# Altium footprint library Vowstar_IC_General.PcbLib: 139 footprints (part 7 of 9)
Each footprint in its own frame and in the unit in brackets; x right, y up, seen from the top. Pads: shape width x height; smd on the part's side, far side on the other; paste and mask are expansions set on the pad; w line width, h text height; cw(c..) or ccw(c..) is an arc to the next point about the centre after c.
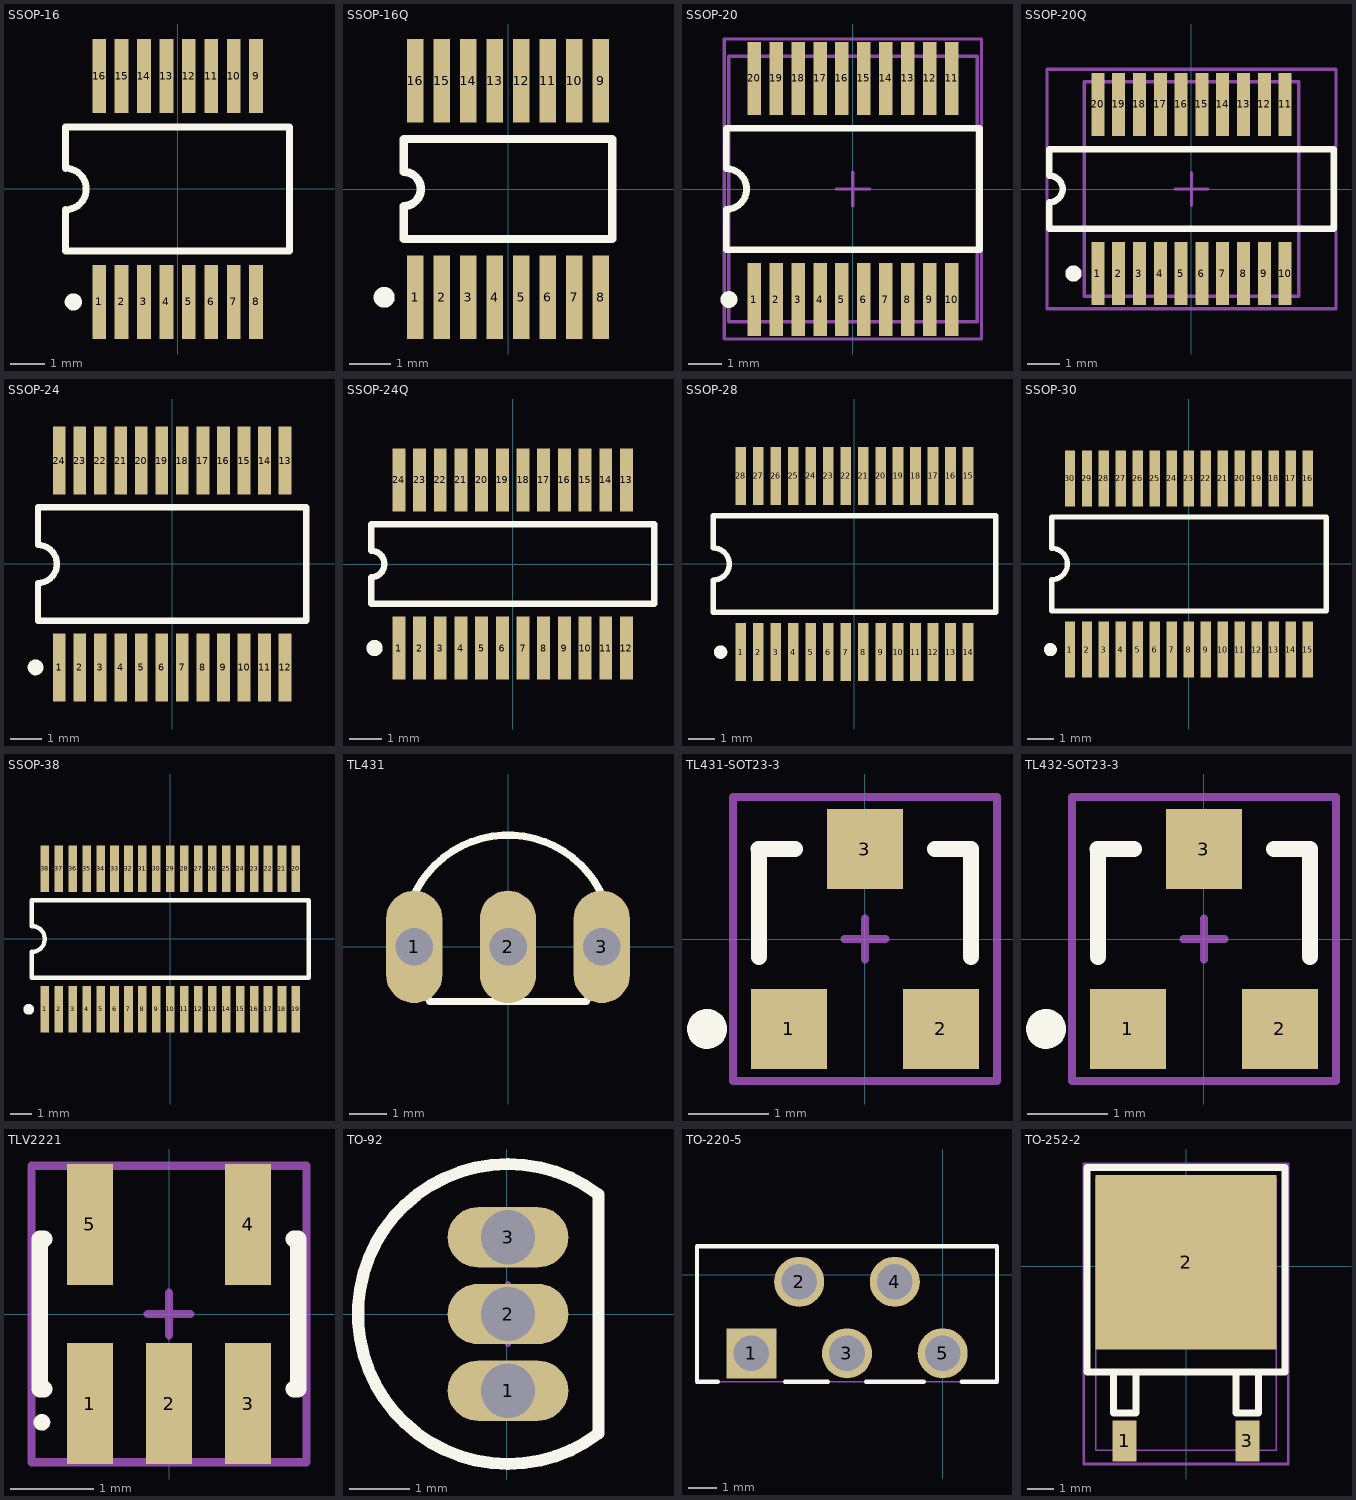
[diagram p6: the footprints below, top view; thin cyan lines are the x and y axes]

## SSOP-16 [mm] "SSOP, Plastic; 16 Leads; Body Width 5.3 mm; Pitch 0.65 mm"
height 2
pads (16):
  rect 0.4x2.15 smd: 1(-2.275,-3.275) 2(-1.625,-3.275) 3(-0.975,-3.275) 4(-0.325,-3.275) 5(0.325,-3.275) 6(0.975,-3.275) 7(1.625,-3.275) 8(2.275,-3.275) 9(2.275,3.275) 10(1.625,3.275) 11(0.975,3.275) 12(0.325,3.275) 13(-0.325,3.275) 14(-0.975,3.275) 15(-1.625,3.275) 16(-2.275,3.275)
Top Overlay:
  circle w0.25: c-3.025,-3.275 r0.125
  lines w0.2: -3.25,-1.8 3.25,-1.8 3.25,1.8 -3.25,1.8 -3.25,0.6 cw(c-3.25,0) -3.25,-0.6 -3.25,-1.8

## SSOP-16Q [mm] "SSOP; 16 Leads; Body Width 3.9 mm; Pitch 0.635 mm"
height 1.76
pads (16):
  rect 0.4x2 smd: 1(-2.222,-2.6) 2(-1.587,-2.6) 3(-0.953,-2.6) 4(-0.318,-2.6) 5(0.318,-2.6) 6(0.953,-2.6) 7(1.587,-2.6) 8(2.222,-2.6) 9(2.222,2.6) 10(1.587,2.6) 11(0.953,2.6) 12(0.318,2.6) 13(-0.318,2.6) 14(-0.953,2.6) 15(-1.587,2.6) 16(-2.222,2.6)
Top Overlay:
  circle w0.25: c-2.973,-2.6 r0.125
  lines w0.2: -2.5,-1.2 -2.5,-0.408 ccw(c-2.5,0) -2.5,0.408 -2.5,1.2 2.5,1.2 2.5,-1.2 -2.5,-1.2

## SSOP-20 [mm] "SSOP, Plastic; 20 Leads; Body Width 5.3 mm; Pitch 0.65 mm"
height 2
pads (20):
  rect 0.4x2.15 smd: 1(-2.925,-3.275) 2(-2.275,-3.275) 3(-1.625,-3.275) 4(-0.975,-3.275) 5(-0.325,-3.275) 6(0.325,-3.275) 7(0.975,-3.275) 8(1.625,-3.275) 9(2.275,-3.275) 10(2.925,-3.275) 11(2.925,3.275) 12(2.275,3.275) 13(1.625,3.275) 14(0.975,3.275) 15(0.325,3.275) 16(-0.325,3.275) 17(-0.975,3.275) 18(-1.625,3.275) 19(-2.275,3.275) 20(-2.925,3.275)
Top Overlay:
  circle w0.25: c-3.675,-3.275 r0.125
  lines w0.2: -3.75,-1.8 3.75,-1.8 3.75,1.8 -3.75,1.8 -3.75,0.6 cw(c-3.75,0) -3.75,-0.6 -3.75,-1.8
Mechanical 13:
  lines w0.1: -3.683,-3.937 -3.683,3.937 3.683,3.937 3.683,-3.937 -3.683,-3.937
Mechanical 15:
  lines w0.1: -0.5,0 0.5,0 ; 0,-0.5 0,0.5 ; -3.81,-4.445 -3.81,4.445 3.81,4.445 3.81,-4.445 -3.81,-4.445
3D body "User Library-SSOP-20.step": height 1.78, standoff -0.21, extent -3.647,-3.937 3.683,3.963

## SSOP-20Q [mm] "SSOP; 20 Leads; Body Width 3.9 mm; Pitch 0.64 mm"
height 1.75
pads (20):
  rect 0.4x1.95 smd: 1(-2.88,-2.6) 2(-2.24,-2.6) 3(-1.6,-2.6) 4(-0.96,-2.6) 5(-0.32,-2.6) 6(0.32,-2.6) 7(0.96,-2.6) 8(1.6,-2.6) 9(2.24,-2.6) 10(2.88,-2.6) 11(2.88,2.6) 12(2.24,2.6) 13(1.6,2.6) 14(0.96,2.6) 15(0.32,2.6) 16(-0.32,2.6) 17(-0.96,2.6) 18(-1.6,2.6) 19(-2.24,2.6) 20(-2.88,2.6)
Top Overlay:
  circle w0.25: c-3.63,-2.6 r0.125
  lines w0.2: -4.375,-1.225 4.375,-1.225 4.375,1.225 -4.375,1.225 -4.375,0.408 cw(c-4.375,0) -4.375,-0.408 -4.375,-1.225
Mechanical 13:
  lines w0.1: -3.302,-3.302 3.302,-3.302 3.302,3.302 -3.302,3.302 -3.302,-3.302
Mechanical 15:
  lines w0.1: -0.5,0 0.5,0 ; 0,-0.5 0,0.5 ; -4.445,-3.683 4.445,-3.683 4.445,3.683 -4.445,3.683 -4.445,-3.683
3D body "User Library-TSSOP-20-1.step": height 1.2, standoff 0, extent -3.302,-3.275 3.298,3.275

## SSOP-24 [mm] "SSOP, Plastic; 24 Leads; Body Width 5.3 mm; Pitch 0.65 mm"
height 2
pads (24):
  rect 0.4x2.15 smd: 1(-3.575,-3.275) 2(-2.925,-3.275) 3(-2.275,-3.275) 4(-1.625,-3.275) 5(-0.975,-3.275) 6(-0.325,-3.275) 7(0.325,-3.275) 8(0.975,-3.275) 9(1.625,-3.275) 10(2.275,-3.275) 11(2.925,-3.275) 12(3.575,-3.275) 13(3.575,3.275) 14(2.925,3.275) 15(2.275,3.275) 16(1.625,3.275) 17(0.975,3.275) 18(0.325,3.275) 19(-0.325,3.275) 20(-0.975,3.275) 21(-1.625,3.275) 22(-2.275,3.275) 23(-2.925,3.275) 24(-3.575,3.275)
Top Overlay:
  circle w0.25: c-4.325,-3.275 r0.125
  lines w0.2: -4.25,-1.8 -4.25,-0.6 ccw(c-4.25,0) -4.25,0.6 -4.25,1.8 4.25,1.8 4.25,-1.8 -4.25,-1.8

## SSOP-24Q [mm] "SSOP; 24 Leads; Body Width 3.9 mm; Pitch 0.64 mm"
height 1.75
pads (24):
  rect 0.4x1.95 smd: 1(-3.52,-2.6) 2(-2.88,-2.6) 3(-2.24,-2.6) 4(-1.6,-2.6) 5(-0.96,-2.6) 6(-0.32,-2.6) 7(0.32,-2.6) 8(0.96,-2.6) 9(1.6,-2.6) 10(2.24,-2.6) 11(2.88,-2.6) 12(3.52,-2.6) 13(3.52,2.6) 14(2.88,2.6) 15(2.24,2.6) 16(1.6,2.6) 17(0.96,2.6) 18(0.32,2.6) 19(-0.32,2.6) 20(-0.96,2.6) 21(-1.6,2.6) 22(-2.24,2.6) 23(-2.88,2.6) 24(-3.52,2.6)
Top Overlay:
  circle w0.25: c-4.27,-2.6 r0.125
  lines w0.2: -4.375,-1.225 4.375,-1.225 4.375,1.225 -4.375,1.225 -4.375,0.408 cw(c-4.375,0) -4.375,-0.408 -4.375,-1.225

## SSOP-28 [mm] "SSOP, Plastic; 28 Leads; Body Width 5.3 mm; Pitch 0.65 mm"
height 2
pads (28):
  rect 0.4x2.15 smd: 1(-4.225,-3.275) 2(-3.575,-3.275) 3(-2.925,-3.275) 4(-2.275,-3.275) 5(-1.625,-3.275) 6(-0.975,-3.275) 7(-0.325,-3.275) 8(0.325,-3.275) 9(0.975,-3.275) 10(1.625,-3.275) 11(2.275,-3.275) 12(2.925,-3.275) 13(3.575,-3.275) 14(4.225,-3.275) 15(4.225,3.275) 16(3.575,3.275) 17(2.925,3.275) 18(2.275,3.275) 19(1.625,3.275) 20(0.975,3.275) 21(0.325,3.275) 22(-0.325,3.275) 23(-0.975,3.275) 24(-1.625,3.275) 25(-2.275,3.275) 26(-2.925,3.275) 27(-3.575,3.275) 28(-4.225,3.275)
Top Overlay:
  circle w0.25: c-4.975,-3.275 r0.125
  lines w0.2: -5.25,-1.8 -5.25,-0.6 ccw(c-5.25,0) -5.25,0.6 -5.25,1.8 5.25,1.8 5.25,-1.8 -5.25,-1.8

## SSOP-30 [mm] "SSOP, Plastic; 30 Leads; Body Width 5.3 mm; Pitch 0.65 mm"
height 2
pads (30):
  rect 0.4x2.15 smd: 1(-4.55,-3.275) 2(-3.9,-3.275) 3(-3.25,-3.275) 4(-2.6,-3.275) 5(-1.95,-3.275) 6(-1.3,-3.275) 7(-0.65,-3.275) 8(0,-3.275) 9(0.65,-3.275) 10(1.3,-3.275) 11(1.95,-3.275) 12(2.6,-3.275) 13(3.25,-3.275) 14(3.9,-3.275) 15(4.55,-3.275) 16(4.55,3.275) 17(3.9,3.275) 18(3.25,3.275) 19(2.6,3.275) 20(1.95,3.275) 21(1.3,3.275) 22(0.65,3.275) 23(0,3.275) 24(-0.65,3.275) 25(-1.3,3.275) 26(-1.95,3.275) 27(-2.6,3.275) 28(-3.25,3.275) 29(-3.9,3.275) 30(-4.55,3.275)
Top Overlay:
  circle w0.25: c-5.3,-3.275 r0.125
  lines w0.2: -5.25,-1.8 -5.25,-0.6 ccw(c-5.25,0) -5.25,0.6 -5.25,1.8 5.25,1.8 5.25,-1.8 -5.25,-1.8

## SSOP-38 [mm] "SSOP, Plastic; 38 Leads; Body Width 5.3 mm; Pitch 0.65 mm"
height 2
pads (38):
  rect 0.4x2.15 smd: 1(-5.85,-3.275) 2(-5.2,-3.275) 3(-4.55,-3.275) 4(-3.9,-3.275) 5(-3.25,-3.275) 6(-2.6,-3.275) 7(-1.95,-3.275) 8(-1.3,-3.275) 9(-0.65,-3.275) 10(0,-3.275) 11(0.65,-3.275) 12(1.3,-3.275) 13(1.95,-3.275) 14(2.6,-3.275) 15(3.25,-3.275) 16(3.9,-3.275) 17(4.55,-3.275) 18(5.2,-3.275) 19(5.85,-3.275) 20(5.85,3.275) 21(5.2,3.275) 22(4.55,3.275) 23(3.9,3.275) 24(3.25,3.275) 25(2.6,3.275) 26(1.95,3.275) 27(1.3,3.275) 28(0.65,3.275) 29(0,3.275) 30(-0.65,3.275) 31(-1.3,3.275) 32(-1.95,3.275) 33(-2.6,3.275) 34(-3.25,3.275) 35(-3.9,3.275) 36(-4.55,3.275) 37(-5.2,3.275) 38(-5.85,3.275)
Top Overlay:
  circle w0.25: c-6.6,-3.275 r0.125
  lines w0.2: -6.45,-1.8 -6.45,-0.6 ccw(c-6.45,0) -6.45,0.6 -6.45,1.8 6.45,1.8 6.45,-1.8 -6.45,-1.8

## TL431 [mil] "TL431"
pads (3):
  oval 60x120 hole 40: 1(-100,0) 2(0,0) 3(100,0)
Top Overlay:
  lines w7.87: -102.76,49.85 cw(c0,8.33) 102.76,49.85 ; -89.08,-49.71 -83.33,-58.33 83.33,-58.33 89.08,-49.71
3D body "User Library-TO-92 (TO-226) Bent Lead.STEP": height 393.7, standoff -118.11, extent -109.84,-60.5 109.84,105

## TL431-SOT23-3 [mm] "TL431"
pads (3):
  rect 0.95x1 smd: 1(-0.95,-1.125) 2(0.95,-1.125) 3(0,1.125)
Top Overlay:
  circle w0.25: c-1.975,-1.125 r0.125
  lines w0.2: -1.328,1.125 -0.875,1.125 ; -1.325,-0.225 -1.325,1.125 ; 0.875,1.125 1.325,1.125 1.325,-0.225
Mechanical 15:
  lines w0.1: -0.254,0 0.254,0 ; 0,-0.254 0,0.254 ; -1.651,-1.778 -1.651,1.778 1.651,1.778 1.651,-1.778 -1.651,-1.778
3D body "User Library-SOT23-3.step": height 1.3, standoff 0, extent -1.448,-1.397 1.452,1.403

## TL432-SOT23-3 [mm] "TL432"
pads (3):
  rect 0.95x1 smd: 1(-0.95,-1.125) 2(0.95,-1.125) 3(0,1.125)
Top Overlay:
  circle w0.25: c-1.975,-1.125 r0.125
  lines w0.2: -1.328,1.125 -0.875,1.125 ; -1.325,-0.225 -1.325,1.125 ; 0.875,1.125 1.325,1.125 1.325,-0.225
Mechanical 15:
  lines w0.1: -0.254,0 0.254,0 ; 0,-0.254 0,0.254 ; -1.651,-1.778 1.651,-1.778 1.651,1.778 -1.651,1.778 -1.651,-1.778
3D body "User Library-SOT23-3.step": height 1.3, standoff 0, extent -1.448,-1.397 1.452,1.403

## TLV2221 [mm] "TLV2221"
height 1.25
pads (5):
  rect 0.55x1.45 smd: 1(-0.95,-1.075) 2(0,-1.075) 3(0.95,-1.075) 4(0.95,1.075) 5(-0.95,1.075)
Top Overlay:
  circle w0.1: c-1.525,-1.3 r0.05
  lines w0.2: -1.5,-0.9 -1.55,-0.9 -1.55,0.9 -1.5,0.9 ; 1.5,-0.9 1.55,-0.9 1.55,0.9 1.5,0.9
Mechanical 15:
  lines w0.1: -0.254,0 0.254,0 ; 0,-0.254 0,0.254 ; -1.651,-1.778 -1.651,1.778 1.651,1.778 1.651,-1.778 -1.651,-1.778
3D body "User Library-SOT23-5.step": height 1.45, standoff 0, extent -1.448,-1.397 1.452,1.403

## TO-92 [mm] "TO-92 3 Pins THT Package"
height 4.6
pads (3):
  oval 2x1 hole 0.9: 1(0.024,-1.27) 2(0.024,0) 3(0.024,1.27)
Top Overlay:
  lines w0.2: 1.524,-1.98 cw(c0.024,0) 1.524,1.98 1.524,-1.98
Mechanical 15:
  lines w0.1: -0.476,0 0.524,0 ; 0.024,-0.5 0.024,0.5
3D body "User Library-TO-92 (TO-226) Straight Lead.STEP": height 10, standoff -3, extent -2.591,-2.613 1.613,2.613

## TO-220-5 [mil] "TO-220-5,KC5"
pads (5):
  rect 70x70 / inner round 60 / far side rect 70x70 hole 50: 1(-268,-110)
  round 70 / inner round 60 / far side round 70 hole 50: 2(-201,-10) 3(-134,-110) 4(-67,-10) 5(0,-110)
Top Overlay:
  lines w6: -315.11,-150 -344,-150 -344,40 76,40 76,-150 26.71,-150 ; -220.89,-150 -160.71,-150 ; -107.29,-150 -26.71,-150
Mechanical 13:
  lines w2: -344,-150 -344,40 76,40 76,-150 -344,-150

## TO-252-2 [mil] "TO-252-2,TD03B"
pads (3):
  rect 35x60 smd: 1(-89.96,-256) 3(89.96,-256)
  rect 265x256 smd paste-1000: 2(0,6)
Top Overlay:
  lines w10: -106.46,-155 -106.46,-215 -73.46,-215 -73.46,-155 ; 73.46,-155 73.46,-215 106.46,-215 106.46,-155 ; -145,-155 -145,145 145,145 145,-155 -145,-155
Top Paste:
  rectangle: 61.14,-115 125,-95
  rectangle: 7.91,-115 45.31,-95
  rectangle: -45.32,-115 -7.91,-95
  rectangle: -125,-115 -61.14,-95
  rectangle: -45,-25 45.31,70
  rectangle: -125,-78.19 -61.14,-40
  rectangle: -45.32,-78.19 -7.91,-40
  rectangle: 7.91,-78.19 45.31,-40
  rectangle: 61.14,-78.19 125,-40
  rectangle: 61.14,86.81 125,125
  rectangle: 7.91,86.81 45.31,125
  rectangle: -45.32,86.81 -7.91,125
  rectangle: -125,86.81 -61.14,125
  rectangle: -125,-25 -59.69,70
  rectangle: 60,-25 125,70
Mechanical 13:
  lines w2: -132.5,-270 132.5,-270 132.5,130 -132.5,130 -132.5,-270
Mechanical 15:
  lines w3.94: -19.68,0 19.68,0 ; 0,-19.68 0,19.68 ; -150,-290 -150,150 150,150 150,-290 -150,-290
3D body "User Library-TO-252AA-DPAK.step": height 93.31, standoff -1.18, extent -132.56,-270 132.56,127.64